# Altium footprint library Connectors.PcbLib: 229 footprints (part 12 of 15)
Each footprint in its own frame and in the unit in brackets; x right, y up, seen from the top. Pads: shape width x height; smd on the part's side, far side on the other; paste and mask are expansions set on the pad; w line width, h text height; cw(c..) or ccw(c..) is an arc to the next point about the centre after c.
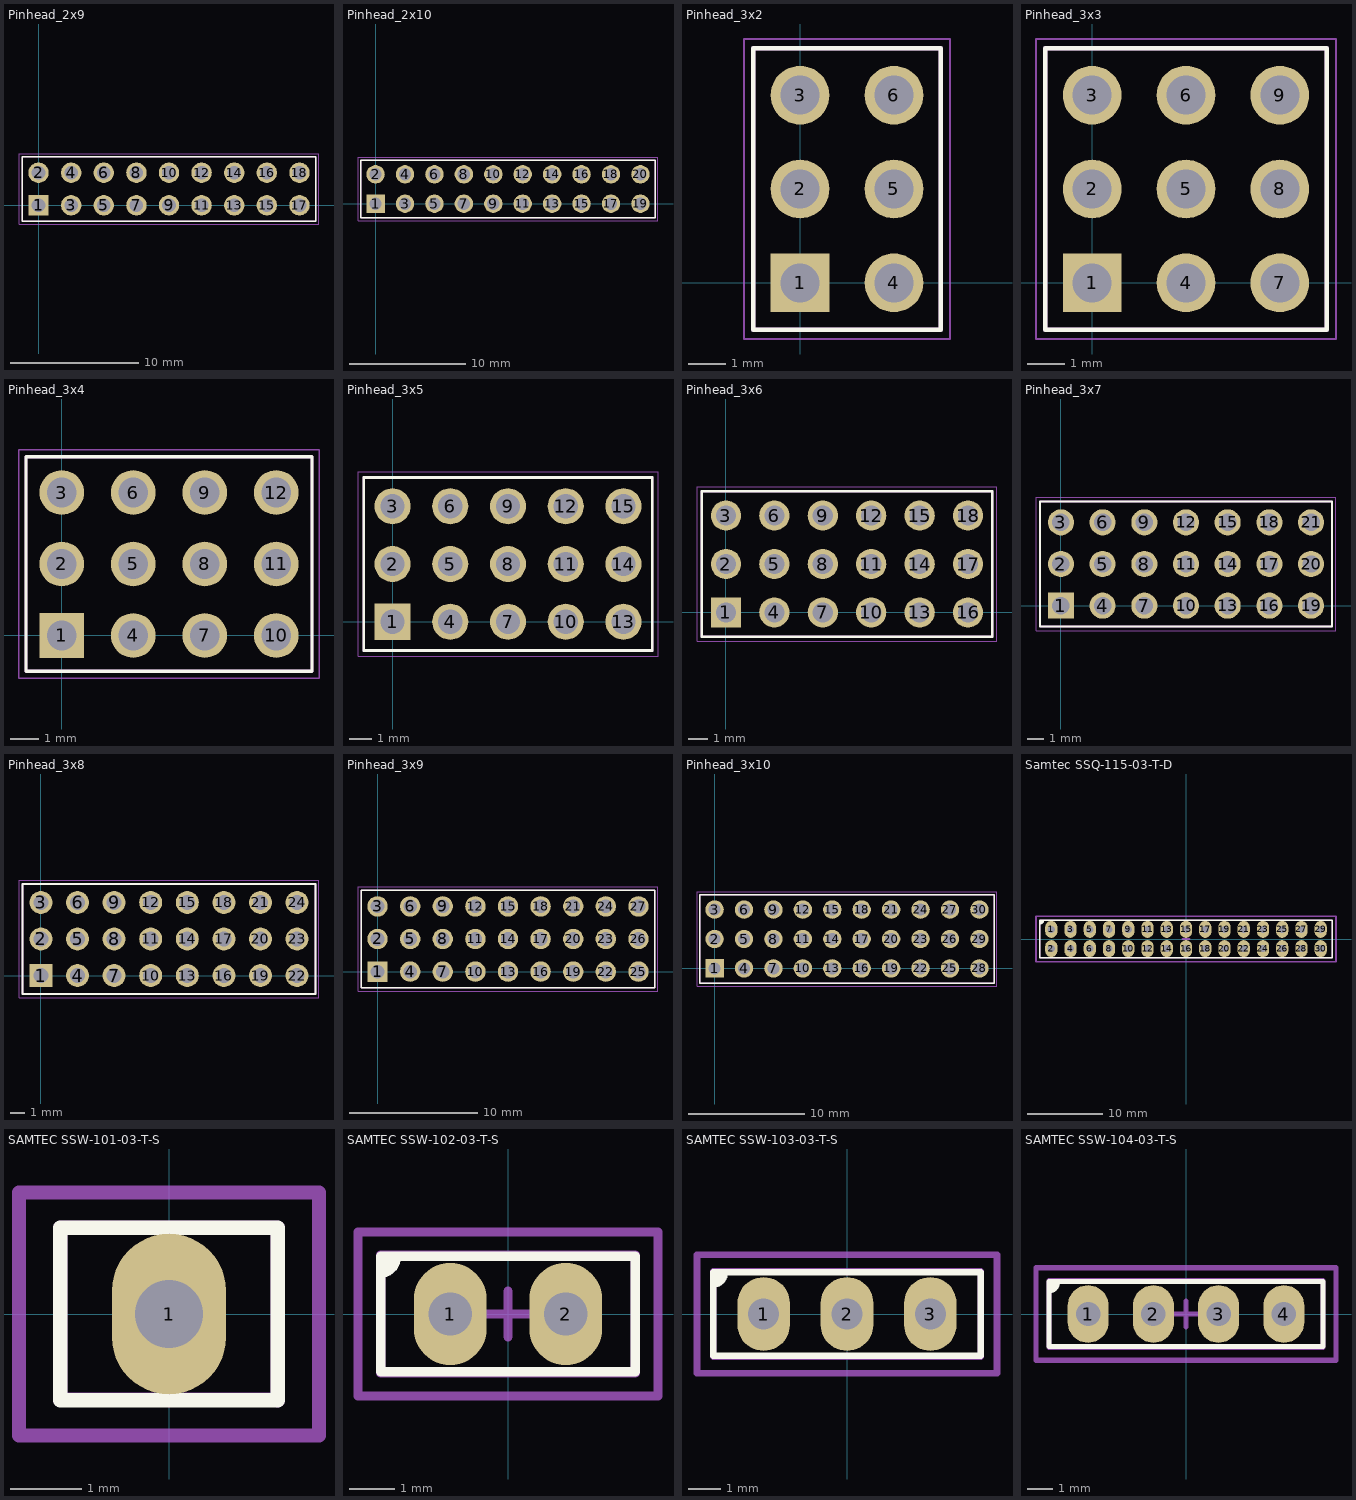
[diagram p11: the footprints below, top view; thin cyan lines are the x and y axes]

## Pinhead_2x9 [mm]
height 8.79
pads (18):
  rect 1.59x1.59 hole 1.06: 1(0,0)
  round 1.59 hole 1.06: 2(0,2.54) 3(2.54,0) 4(2.54,2.54) 5(5.08,0) 6(5.08,2.54) 7(7.62,0) 8(7.62,2.54) 9(10.16,0) 10(10.16,2.54) 11(12.7,0) 12(12.7,2.54) 13(15.24,0) 14(15.24,2.54) 15(17.78,0) 16(17.78,2.54) 17(20.32,0) 18(20.32,2.54)
Top Overlay:
  lines w0.12: -1.27,-1.23 21.59,-1.23 21.59,3.77 -1.27,3.77 -1.27,-1.23
Mechanical 8:
  lines w0.12: -1.27,-1.23 21.59,-1.23 21.59,3.77 -1.27,3.77 -1.27,-1.23
Mechanical 13:
  lines w0.025: -1.27,-1.23 21.59,-1.23 21.59,3.77 -1.27,3.77 -1.27,-1.23 ; -0.32,-0.32 0.32,-0.32 0.32,0.32 -0.32,0.32 -0.32,-0.32 ; -0.32,2.22 0.32,2.22 0.32,2.86 -0.32,2.86 -0.32,2.22 ; 2.22,-0.32 2.86,-0.32 2.86,0.32 2.22,0.32 2.22,-0.32 ; 2.22,2.22 2.86,2.22 2.86,2.86 2.22,2.86 2.22,2.22 ; 4.76,-0.32 5.4,-0.32 5.4,0.32 4.76,0.32 4.76,-0.32 ; 4.76,2.22 5.4,2.22 5.4,2.86 4.76,2.86 4.76,2.22 ; 7.3,-0.32 7.94,-0.32 7.94,0.32 7.3,0.32 7.3,-0.32 ; 7.3,2.22 7.94,2.22 7.94,2.86 7.3,2.86 7.3,2.22 ; 9.84,-0.32 10.48,-0.32 10.48,0.32 9.84,0.32 9.84,-0.32 ; 9.84,2.22 10.48,2.22 10.48,2.86 9.84,2.86 9.84,2.22 ; 12.38,-0.32 13.02,-0.32 13.02,0.32 12.38,0.32 12.38,-0.32 ; 12.38,2.22 13.02,2.22 13.02,2.86 12.38,2.86 12.38,2.22 ; 14.92,-0.32 15.56,-0.32 15.56,0.32 14.92,0.32 14.92,-0.32 ; 14.92,2.22 15.56,2.22 15.56,2.86 14.92,2.86 14.92,2.22 ; 17.46,-0.32 18.1,-0.32 18.1,0.32 17.46,0.32 17.46,-0.32 ; 17.46,2.22 18.1,2.22 18.1,2.86 17.46,2.86 17.46,2.22 ; 20,-0.32 20.64,-0.32 20.64,0.32 20,0.32 20,-0.32 ; 20,2.22 20.64,2.22 20.64,2.86 20,2.86 20,2.22
Mechanical 15:
  circle w0.05: c0,0 r0.25
  lines w0.05: -0.35,0 0.35,0 ; 0,-0.35 0,0.35 ; -1.52,-1.48 21.84,-1.48 21.84,4.02 -1.52,4.02 -1.52,-1.48
3D body: height 8.79, standoff -2.3, extent -1.27,-1.23 21.59,3.77

## Pinhead_2x10 [mm]
height 8.79
pads (20):
  rect 1.59x1.59 hole 1.06: 1(0,0)
  round 1.59 hole 1.06: 2(0,2.54) 3(2.54,0) 4(2.54,2.54) 5(5.08,0) 6(5.08,2.54) 7(7.62,0) 8(7.62,2.54) 9(10.16,0) 10(10.16,2.54) 11(12.7,0) 12(12.7,2.54) 13(15.24,0) 14(15.24,2.54) 15(17.78,0) 16(17.78,2.54) 17(20.32,0) 18(20.32,2.54) 19(22.86,0) 20(22.86,2.54)
Top Overlay:
  lines w0.12: -1.27,-1.23 24.13,-1.23 24.13,3.77 -1.27,3.77 -1.27,-1.23
Mechanical 8:
  lines w0.12: -1.27,-1.23 24.13,-1.23 24.13,3.77 -1.27,3.77 -1.27,-1.23
Mechanical 13:
  lines w0.025: -1.27,-1.23 24.13,-1.23 24.13,3.77 -1.27,3.77 -1.27,-1.23 ; -0.32,-0.32 0.32,-0.32 0.32,0.32 -0.32,0.32 -0.32,-0.32 ; -0.32,2.22 0.32,2.22 0.32,2.86 -0.32,2.86 -0.32,2.22 ; 2.22,-0.32 2.86,-0.32 2.86,0.32 2.22,0.32 2.22,-0.32 ; 2.22,2.22 2.86,2.22 2.86,2.86 2.22,2.86 2.22,2.22 ; 4.76,-0.32 5.4,-0.32 5.4,0.32 4.76,0.32 4.76,-0.32 ; 4.76,2.22 5.4,2.22 5.4,2.86 4.76,2.86 4.76,2.22 ; 7.3,-0.32 7.94,-0.32 7.94,0.32 7.3,0.32 7.3,-0.32 ; 7.3,2.22 7.94,2.22 7.94,2.86 7.3,2.86 7.3,2.22 ; 9.84,-0.32 10.48,-0.32 10.48,0.32 9.84,0.32 9.84,-0.32 ; 9.84,2.22 10.48,2.22 10.48,2.86 9.84,2.86 9.84,2.22 ; 12.38,-0.32 13.02,-0.32 13.02,0.32 12.38,0.32 12.38,-0.32 ; 12.38,2.22 13.02,2.22 13.02,2.86 12.38,2.86 12.38,2.22 ; 14.92,-0.32 15.56,-0.32 15.56,0.32 14.92,0.32 14.92,-0.32 ; 14.92,2.22 15.56,2.22 15.56,2.86 14.92,2.86 14.92,2.22 ; 17.46,-0.32 18.1,-0.32 18.1,0.32 17.46,0.32 17.46,-0.32 ; 17.46,2.22 18.1,2.22 18.1,2.86 17.46,2.86 17.46,2.22 ; 20,-0.32 20.64,-0.32 20.64,0.32 20,0.32 20,-0.32 ; 20,2.22 20.64,2.22 20.64,2.86 20,2.86 20,2.22 ; 22.54,-0.32 23.18,-0.32 23.18,0.32 22.54,0.32 22.54,-0.32 ; 22.54,2.22 23.18,2.22 23.18,2.86 22.54,2.86 22.54,2.22
Mechanical 15:
  circle w0.05: c0,0 r0.25
  lines w0.05: -0.35,0 0.35,0 ; 0,-0.35 0,0.35 ; -1.52,-1.48 24.38,-1.48 24.38,4.02 -1.52,4.02 -1.52,-1.48
3D body: height 8.79, standoff -2.3, extent -1.27,-1.23 24.13,3.77

## Pinhead_3x2 [mm]
height 8.79
pads (6):
  rect 1.59x1.59 hole 1.06: 1(0,0)
  round 1.59 hole 1.06: 2(0,2.54) 3(0,5.08) 4(2.54,0) 5(2.54,2.54) 6(2.54,5.08)
Top Overlay:
  lines w0.12: -1.27,-1.27 -1.27,6.35 3.81,6.35 3.81,-1.27 -1.27,-1.27
Mechanical 8:
  lines w0.12: -1.27,-1.27 -1.27,6.35 3.81,6.35 3.81,-1.27 -1.27,-1.27
Mechanical 13:
  lines w0.025: -1.27,-1.27 -1.27,6.35 3.81,6.35 3.81,-1.27 -1.27,-1.27 ; -0.32,-0.32 -0.32,0.32 0.32,0.32 0.32,-0.32 -0.32,-0.32 ; -0.32,2.22 -0.32,2.86 0.32,2.86 0.32,2.22 -0.32,2.22 ; -0.32,4.76 -0.32,5.4 0.32,5.4 0.32,4.76 -0.32,4.76 ; 2.22,-0.32 2.22,0.32 2.86,0.32 2.86,-0.32 2.22,-0.32 ; 2.22,2.22 2.22,2.86 2.86,2.86 2.86,2.22 2.22,2.22 ; 2.22,4.76 2.22,5.4 2.86,5.4 2.86,4.76 2.22,4.76
Mechanical 15:
  circle w0.05: c0,0 r0.25
  lines w0.05: -0.35,0 0.35,0 ; 0,-0.35 0,0.35 ; -1.52,-1.52 -1.52,6.6 4.06,6.6 4.06,-1.52 -1.52,-1.52
3D body: height 8.79, standoff -2.3, extent -1.27,-1.27 3.81,6.35

## Pinhead_3x3 [mm]
height 8.79
pads (9):
  rect 1.59x1.59 hole 1.06: 1(0,0)
  round 1.59 hole 1.06: 2(0,2.54) 3(0,5.08) 4(2.54,0) 5(2.54,2.54) 6(2.54,5.08) 7(5.08,0) 8(5.08,2.54) 9(5.08,5.08)
Top Overlay:
  lines w0.12: -1.27,-1.27 6.35,-1.27 6.35,6.35 -1.27,6.35 -1.27,-1.27
Mechanical 8:
  lines w0.12: -1.27,-1.27 6.35,-1.27 6.35,6.35 -1.27,6.35 -1.27,-1.27
Mechanical 13:
  lines w0.025: -1.27,-1.27 6.35,-1.27 6.35,6.35 -1.27,6.35 -1.27,-1.27 ; -0.32,-0.32 0.32,-0.32 0.32,0.32 -0.32,0.32 -0.32,-0.32 ; -0.32,2.22 0.32,2.22 0.32,2.86 -0.32,2.86 -0.32,2.22 ; -0.32,4.76 0.32,4.76 0.32,5.4 -0.32,5.4 -0.32,4.76 ; 2.22,-0.32 2.86,-0.32 2.86,0.32 2.22,0.32 2.22,-0.32 ; 2.22,2.22 2.86,2.22 2.86,2.86 2.22,2.86 2.22,2.22 ; 2.22,4.76 2.86,4.76 2.86,5.4 2.22,5.4 2.22,4.76 ; 4.76,-0.32 5.4,-0.32 5.4,0.32 4.76,0.32 4.76,-0.32 ; 4.76,2.22 5.4,2.22 5.4,2.86 4.76,2.86 4.76,2.22 ; 4.76,4.76 5.4,4.76 5.4,5.4 4.76,5.4 4.76,4.76
Mechanical 15:
  circle w0.05: c0,0 r0.25
  lines w0.05: -0.35,0 0.35,0 ; 0,-0.35 0,0.35 ; -1.52,-1.52 6.6,-1.52 6.6,6.6 -1.52,6.6 -1.52,-1.52
3D body: height 8.79, standoff -2.3, extent -1.27,-1.27 6.35,6.35

## Pinhead_3x4 [mm]
height 8.79
pads (12):
  rect 1.59x1.59 hole 1.06: 1(0,0)
  round 1.59 hole 1.06: 2(0,2.54) 3(0,5.08) 4(2.54,0) 5(2.54,2.54) 6(2.54,5.08) 7(5.08,0) 8(5.08,2.54) 9(5.08,5.08) 10(7.62,0) 11(7.62,2.54) 12(7.62,5.08)
Top Overlay:
  lines w0.12: -1.27,-1.27 8.89,-1.27 8.89,6.35 -1.27,6.35 -1.27,-1.27
Mechanical 8:
  lines w0.12: -1.27,-1.27 8.89,-1.27 8.89,6.35 -1.27,6.35 -1.27,-1.27
Mechanical 13:
  lines w0.025: -1.27,-1.27 8.89,-1.27 8.89,6.35 -1.27,6.35 -1.27,-1.27 ; -0.32,-0.32 0.32,-0.32 0.32,0.32 -0.32,0.32 -0.32,-0.32 ; -0.32,2.22 0.32,2.22 0.32,2.86 -0.32,2.86 -0.32,2.22 ; -0.32,4.76 0.32,4.76 0.32,5.4 -0.32,5.4 -0.32,4.76 ; 2.22,-0.32 2.86,-0.32 2.86,0.32 2.22,0.32 2.22,-0.32 ; 2.22,2.22 2.86,2.22 2.86,2.86 2.22,2.86 2.22,2.22 ; 2.22,4.76 2.86,4.76 2.86,5.4 2.22,5.4 2.22,4.76 ; 4.76,-0.32 5.4,-0.32 5.4,0.32 4.76,0.32 4.76,-0.32 ; 4.76,2.22 5.4,2.22 5.4,2.86 4.76,2.86 4.76,2.22 ; 4.76,4.76 5.4,4.76 5.4,5.4 4.76,5.4 4.76,4.76 ; 7.3,-0.32 7.94,-0.32 7.94,0.32 7.3,0.32 7.3,-0.32 ; 7.3,2.22 7.94,2.22 7.94,2.86 7.3,2.86 7.3,2.22 ; 7.3,4.76 7.94,4.76 7.94,5.4 7.3,5.4 7.3,4.76
Mechanical 15:
  circle w0.05: c0,0 r0.25
  lines w0.05: -0.35,0 0.35,0 ; 0,-0.35 0,0.35 ; -1.52,-1.52 9.14,-1.52 9.14,6.6 -1.52,6.6 -1.52,-1.52
3D body: height 8.79, standoff -2.3, extent -1.27,-1.27 8.89,6.35

## Pinhead_3x5 [mm]
height 8.79
pads (15):
  rect 1.59x1.59 hole 1.06: 1(0,0)
  round 1.59 hole 1.06: 2(0,2.54) 3(0,5.08) 4(2.54,0) 5(2.54,2.54) 6(2.54,5.08) 7(5.08,0) 8(5.08,2.54) 9(5.08,5.08) 10(7.62,0) 11(7.62,2.54) 12(7.62,5.08) 13(10.16,0) 14(10.16,2.54) 15(10.16,5.08)
Top Overlay:
  lines w0.12: -1.27,-1.27 11.43,-1.27 11.43,6.35 -1.27,6.35 -1.27,-1.27
Mechanical 8:
  lines w0.12: -1.27,-1.27 11.43,-1.27 11.43,6.35 -1.27,6.35 -1.27,-1.27
Mechanical 13:
  lines w0.025: -1.27,-1.27 11.43,-1.27 11.43,6.35 -1.27,6.35 -1.27,-1.27 ; -0.32,-0.32 0.32,-0.32 0.32,0.32 -0.32,0.32 -0.32,-0.32 ; -0.32,2.22 0.32,2.22 0.32,2.86 -0.32,2.86 -0.32,2.22 ; -0.32,4.76 0.32,4.76 0.32,5.4 -0.32,5.4 -0.32,4.76 ; 2.22,-0.32 2.86,-0.32 2.86,0.32 2.22,0.32 2.22,-0.32 ; 2.22,2.22 2.86,2.22 2.86,2.86 2.22,2.86 2.22,2.22 ; 2.22,4.76 2.86,4.76 2.86,5.4 2.22,5.4 2.22,4.76 ; 4.76,-0.32 5.4,-0.32 5.4,0.32 4.76,0.32 4.76,-0.32 ; 4.76,2.22 5.4,2.22 5.4,2.86 4.76,2.86 4.76,2.22 ; 4.76,4.76 5.4,4.76 5.4,5.4 4.76,5.4 4.76,4.76 ; 7.3,-0.32 7.94,-0.32 7.94,0.32 7.3,0.32 7.3,-0.32 ; 7.3,2.22 7.94,2.22 7.94,2.86 7.3,2.86 7.3,2.22 ; 7.3,4.76 7.94,4.76 7.94,5.4 7.3,5.4 7.3,4.76 ; 9.84,-0.32 10.48,-0.32 10.48,0.32 9.84,0.32 9.84,-0.32 ; 9.84,2.22 10.48,2.22 10.48,2.86 9.84,2.86 9.84,2.22 ; 9.84,4.76 10.48,4.76 10.48,5.4 9.84,5.4 9.84,4.76
Mechanical 15:
  circle w0.05: c0,0 r0.25
  lines w0.05: -0.35,0 0.35,0 ; 0,-0.35 0,0.35 ; -1.52,-1.52 11.68,-1.52 11.68,6.6 -1.52,6.6 -1.52,-1.52
3D body: height 8.79, standoff -2.3, extent -1.27,-1.27 11.43,6.35

## Pinhead_3x6 [mm]
height 8.79
pads (18):
  rect 1.59x1.59 hole 1.06: 1(0,0)
  round 1.59 hole 1.06: 2(0,2.54) 3(0,5.08) 4(2.54,0) 5(2.54,2.54) 6(2.54,5.08) 7(5.08,0) 8(5.08,2.54) 9(5.08,5.08) 10(7.62,0) 11(7.62,2.54) 12(7.62,5.08) 13(10.16,0) 14(10.16,2.54) 15(10.16,5.08) 16(12.7,0) 17(12.7,2.54) 18(12.7,5.08)
Top Overlay:
  lines w0.12: -1.27,-1.27 13.97,-1.27 13.97,6.35 -1.27,6.35 -1.27,-1.27
Mechanical 8:
  lines w0.12: -1.27,-1.27 13.97,-1.27 13.97,6.35 -1.27,6.35 -1.27,-1.27
Mechanical 13:
  lines w0.025: -1.27,-1.27 13.97,-1.27 13.97,6.35 -1.27,6.35 -1.27,-1.27 ; -0.32,-0.32 0.32,-0.32 0.32,0.32 -0.32,0.32 -0.32,-0.32 ; -0.32,2.22 0.32,2.22 0.32,2.86 -0.32,2.86 -0.32,2.22 ; -0.32,4.76 0.32,4.76 0.32,5.4 -0.32,5.4 -0.32,4.76 ; 2.22,-0.32 2.86,-0.32 2.86,0.32 2.22,0.32 2.22,-0.32 ; 2.22,2.22 2.86,2.22 2.86,2.86 2.22,2.86 2.22,2.22 ; 2.22,4.76 2.86,4.76 2.86,5.4 2.22,5.4 2.22,4.76 ; 4.76,-0.32 5.4,-0.32 5.4,0.32 4.76,0.32 4.76,-0.32 ; 4.76,2.22 5.4,2.22 5.4,2.86 4.76,2.86 4.76,2.22 ; 4.76,4.76 5.4,4.76 5.4,5.4 4.76,5.4 4.76,4.76 ; 7.3,-0.32 7.94,-0.32 7.94,0.32 7.3,0.32 7.3,-0.32 ; 7.3,2.22 7.94,2.22 7.94,2.86 7.3,2.86 7.3,2.22 ; 7.3,4.76 7.94,4.76 7.94,5.4 7.3,5.4 7.3,4.76 ; 9.84,-0.32 10.48,-0.32 10.48,0.32 9.84,0.32 9.84,-0.32 ; 9.84,2.22 10.48,2.22 10.48,2.86 9.84,2.86 9.84,2.22 ; 9.84,4.76 10.48,4.76 10.48,5.4 9.84,5.4 9.84,4.76 ; 12.38,-0.32 13.02,-0.32 13.02,0.32 12.38,0.32 12.38,-0.32 ; 12.38,2.22 13.02,2.22 13.02,2.86 12.38,2.86 12.38,2.22 ; 12.38,4.76 13.02,4.76 13.02,5.4 12.38,5.4 12.38,4.76
Mechanical 15:
  circle w0.05: c0,0 r0.25
  lines w0.05: -0.35,0 0.35,0 ; 0,-0.35 0,0.35 ; -1.52,-1.52 14.22,-1.52 14.22,6.6 -1.52,6.6 -1.52,-1.52
3D body: height 8.79, standoff -2.3, extent -1.27,-1.27 13.97,6.35

## Pinhead_3x7 [mm]
height 8.79
pads (21):
  rect 1.59x1.59 hole 1.06: 1(0,0)
  round 1.59 hole 1.06: 2(0,2.54) 3(0,5.08) 4(2.54,0) 5(2.54,2.54) 6(2.54,5.08) 7(5.08,0) 8(5.08,2.54) 9(5.08,5.08) 10(7.62,0) 11(7.62,2.54) 12(7.62,5.08) 13(10.16,0) 14(10.16,2.54) 15(10.16,5.08) 16(12.7,0) 17(12.7,2.54) 18(12.7,5.08) 19(15.24,0) 20(15.24,2.54) 21(15.24,5.08)
Top Overlay:
  lines w0.12: -1.27,-1.27 16.51,-1.27 16.51,6.35 -1.27,6.35 -1.27,-1.27
Mechanical 8:
  lines w0.12: -1.27,-1.27 16.51,-1.27 16.51,6.35 -1.27,6.35 -1.27,-1.27
Mechanical 13:
  lines w0.025: -1.27,-1.27 16.51,-1.27 16.51,6.35 -1.27,6.35 -1.27,-1.27 ; -0.32,-0.32 0.32,-0.32 0.32,0.32 -0.32,0.32 -0.32,-0.32 ; -0.32,2.22 0.32,2.22 0.32,2.86 -0.32,2.86 -0.32,2.22 ; -0.32,4.76 0.32,4.76 0.32,5.4 -0.32,5.4 -0.32,4.76 ; 2.22,-0.32 2.86,-0.32 2.86,0.32 2.22,0.32 2.22,-0.32 ; 2.22,2.22 2.86,2.22 2.86,2.86 2.22,2.86 2.22,2.22 ; 2.22,4.76 2.86,4.76 2.86,5.4 2.22,5.4 2.22,4.76 ; 4.76,-0.32 5.4,-0.32 5.4,0.32 4.76,0.32 4.76,-0.32 ; 4.76,2.22 5.4,2.22 5.4,2.86 4.76,2.86 4.76,2.22 ; 4.76,4.76 5.4,4.76 5.4,5.4 4.76,5.4 4.76,4.76 ; 7.3,-0.32 7.94,-0.32 7.94,0.32 7.3,0.32 7.3,-0.32 ; 7.3,2.22 7.94,2.22 7.94,2.86 7.3,2.86 7.3,2.22 ; 7.3,4.76 7.94,4.76 7.94,5.4 7.3,5.4 7.3,4.76 ; 9.84,-0.32 10.48,-0.32 10.48,0.32 9.84,0.32 9.84,-0.32 ; 9.84,2.22 10.48,2.22 10.48,2.86 9.84,2.86 9.84,2.22 ; 9.84,4.76 10.48,4.76 10.48,5.4 9.84,5.4 9.84,4.76 ; 12.38,-0.32 13.02,-0.32 13.02,0.32 12.38,0.32 12.38,-0.32 ; 12.38,2.22 13.02,2.22 13.02,2.86 12.38,2.86 12.38,2.22 ; 12.38,4.76 13.02,4.76 13.02,5.4 12.38,5.4 12.38,4.76 ; 14.92,-0.32 15.56,-0.32 15.56,0.32 14.92,0.32 14.92,-0.32 ; 14.92,2.22 15.56,2.22 15.56,2.86 14.92,2.86 14.92,2.22 ; 14.92,4.76 15.56,4.76 15.56,5.4 14.92,5.4 14.92,4.76
Mechanical 15:
  circle w0.05: c0,0 r0.25
  lines w0.05: -0.35,0 0.35,0 ; 0,-0.35 0,0.35 ; -1.52,-1.52 16.76,-1.52 16.76,6.6 -1.52,6.6 -1.52,-1.52
3D body: height 8.79, standoff -2.3, extent -1.27,-1.27 16.51,6.35

## Pinhead_3x8 [mm]
height 8.79
pads (24):
  rect 1.59x1.59 hole 1.06: 1(0,0)
  round 1.59 hole 1.06: 2(0,2.54) 3(0,5.08) 4(2.54,0) 5(2.54,2.54) 6(2.54,5.08) 7(5.08,0) 8(5.08,2.54) 9(5.08,5.08) 10(7.62,0) 11(7.62,2.54) 12(7.62,5.08) 13(10.16,0) 14(10.16,2.54) 15(10.16,5.08) 16(12.7,0) 17(12.7,2.54) 18(12.7,5.08) 19(15.24,0) 20(15.24,2.54) 21(15.24,5.08) 22(17.78,0) 23(17.78,2.54) 24(17.78,5.08)
Top Overlay:
  lines w0.12: -1.27,-1.27 19.05,-1.27 19.05,6.35 -1.27,6.35 -1.27,-1.27
Mechanical 8:
  lines w0.12: -1.27,-1.27 19.05,-1.27 19.05,6.35 -1.27,6.35 -1.27,-1.27
Mechanical 13:
  lines w0.025: -1.27,-1.27 19.05,-1.27 19.05,6.35 -1.27,6.35 -1.27,-1.27 ; -0.32,-0.32 0.32,-0.32 0.32,0.32 -0.32,0.32 -0.32,-0.32 ; -0.32,2.22 0.32,2.22 0.32,2.86 -0.32,2.86 -0.32,2.22 ; -0.32,4.76 0.32,4.76 0.32,5.4 -0.32,5.4 -0.32,4.76 ; 2.22,-0.32 2.86,-0.32 2.86,0.32 2.22,0.32 2.22,-0.32 ; 2.22,2.22 2.86,2.22 2.86,2.86 2.22,2.86 2.22,2.22 ; 2.22,4.76 2.86,4.76 2.86,5.4 2.22,5.4 2.22,4.76 ; 4.76,-0.32 5.4,-0.32 5.4,0.32 4.76,0.32 4.76,-0.32 ; 4.76,2.22 5.4,2.22 5.4,2.86 4.76,2.86 4.76,2.22 ; 4.76,4.76 5.4,4.76 5.4,5.4 4.76,5.4 4.76,4.76 ; 7.3,-0.32 7.94,-0.32 7.94,0.32 7.3,0.32 7.3,-0.32 ; 7.3,2.22 7.94,2.22 7.94,2.86 7.3,2.86 7.3,2.22 ; 7.3,4.76 7.94,4.76 7.94,5.4 7.3,5.4 7.3,4.76 ; 9.84,-0.32 10.48,-0.32 10.48,0.32 9.84,0.32 9.84,-0.32 ; 9.84,2.22 10.48,2.22 10.48,2.86 9.84,2.86 9.84,2.22 ; 9.84,4.76 10.48,4.76 10.48,5.4 9.84,5.4 9.84,4.76 ; 12.38,-0.32 13.02,-0.32 13.02,0.32 12.38,0.32 12.38,-0.32 ; 12.38,2.22 13.02,2.22 13.02,2.86 12.38,2.86 12.38,2.22 ; 12.38,4.76 13.02,4.76 13.02,5.4 12.38,5.4 12.38,4.76 ; 14.92,-0.32 15.56,-0.32 15.56,0.32 14.92,0.32 14.92,-0.32 ; 14.92,2.22 15.56,2.22 15.56,2.86 14.92,2.86 14.92,2.22 ; 14.92,4.76 15.56,4.76 15.56,5.4 14.92,5.4 14.92,4.76 ; 17.46,-0.32 18.1,-0.32 18.1,0.32 17.46,0.32 17.46,-0.32 ; 17.46,2.22 18.1,2.22 18.1,2.86 17.46,2.86 17.46,2.22 ; 17.46,4.76 18.1,4.76 18.1,5.4 17.46,5.4 17.46,4.76
Mechanical 15:
  circle w0.05: c0,0 r0.25
  lines w0.05: -0.35,0 0.35,0 ; 0,-0.35 0,0.35 ; -1.52,-1.52 19.3,-1.52 19.3,6.6 -1.52,6.6 -1.52,-1.52
3D body: height 8.79, standoff -2.3, extent -1.27,-1.27 19.05,6.35

## Pinhead_3x9 [mm]
height 8.79
pads (27):
  rect 1.59x1.59 hole 1.06: 1(0,0)
  round 1.59 hole 1.06: 2(0,2.54) 3(0,5.08) 4(2.54,0) 5(2.54,2.54) 6(2.54,5.08) 7(5.08,0) 8(5.08,2.54) 9(5.08,5.08) 10(7.62,0) 11(7.62,2.54) 12(7.62,5.08) 13(10.16,0) 14(10.16,2.54) 15(10.16,5.08) 16(12.7,0) 17(12.7,2.54) 18(12.7,5.08) 19(15.24,0) 20(15.24,2.54) 21(15.24,5.08) 22(17.78,0) 23(17.78,2.54) 24(17.78,5.08) 25(20.32,0) 26(20.32,2.54) 27(20.32,5.08)
Top Overlay:
  lines w0.12: -1.27,-1.27 21.59,-1.27 21.59,6.35 -1.27,6.35 -1.27,-1.27
Mechanical 8:
  lines w0.12: -1.27,-1.27 21.59,-1.27 21.59,6.35 -1.27,6.35 -1.27,-1.27
Mechanical 13:
  lines w0.025: -1.27,-1.27 21.59,-1.27 21.59,6.35 -1.27,6.35 -1.27,-1.27 ; -0.32,-0.32 0.32,-0.32 0.32,0.32 -0.32,0.32 -0.32,-0.32 ; -0.32,2.22 0.32,2.22 0.32,2.86 -0.32,2.86 -0.32,2.22 ; -0.32,4.76 0.32,4.76 0.32,5.4 -0.32,5.4 -0.32,4.76 ; 2.22,-0.32 2.86,-0.32 2.86,0.32 2.22,0.32 2.22,-0.32 ; 2.22,2.22 2.86,2.22 2.86,2.86 2.22,2.86 2.22,2.22 ; 2.22,4.76 2.86,4.76 2.86,5.4 2.22,5.4 2.22,4.76 ; 4.76,-0.32 5.4,-0.32 5.4,0.32 4.76,0.32 4.76,-0.32 ; 4.76,2.22 5.4,2.22 5.4,2.86 4.76,2.86 4.76,2.22 ; 4.76,4.76 5.4,4.76 5.4,5.4 4.76,5.4 4.76,4.76 ; 7.3,-0.32 7.94,-0.32 7.94,0.32 7.3,0.32 7.3,-0.32 ; 7.3,2.22 7.94,2.22 7.94,2.86 7.3,2.86 7.3,2.22 ; 7.3,4.76 7.94,4.76 7.94,5.4 7.3,5.4 7.3,4.76 ; 9.84,-0.32 10.48,-0.32 10.48,0.32 9.84,0.32 9.84,-0.32 ; 9.84,2.22 10.48,2.22 10.48,2.86 9.84,2.86 9.84,2.22 ; 9.84,4.76 10.48,4.76 10.48,5.4 9.84,5.4 9.84,4.76 ; 12.38,-0.32 13.02,-0.32 13.02,0.32 12.38,0.32 12.38,-0.32 ; 12.38,2.22 13.02,2.22 13.02,2.86 12.38,2.86 12.38,2.22 ; 12.38,4.76 13.02,4.76 13.02,5.4 12.38,5.4 12.38,4.76 ; 14.92,-0.32 15.56,-0.32 15.56,0.32 14.92,0.32 14.92,-0.32 ; 14.92,2.22 15.56,2.22 15.56,2.86 14.92,2.86 14.92,2.22 ; 14.92,4.76 15.56,4.76 15.56,5.4 14.92,5.4 14.92,4.76 ; 17.46,-0.32 18.1,-0.32 18.1,0.32 17.46,0.32 17.46,-0.32 ; 17.46,2.22 18.1,2.22 18.1,2.86 17.46,2.86 17.46,2.22 ; 17.46,4.76 18.1,4.76 18.1,5.4 17.46,5.4 17.46,4.76 ; 20,-0.32 20.64,-0.32 20.64,0.32 20,0.32 20,-0.32 ; 20,2.22 20.64,2.22 20.64,2.86 20,2.86 20,2.22 ; 20,4.76 20.64,4.76 20.64,5.4 20,5.4 20,4.76
Mechanical 15:
  circle w0.05: c0,0 r0.25
  lines w0.05: -0.35,0 0.35,0 ; 0,-0.35 0,0.35 ; -1.52,-1.52 21.84,-1.52 21.84,6.6 -1.52,6.6 -1.52,-1.52
3D body: height 8.79, standoff -2.3, extent -1.27,-1.27 21.59,6.35

## Pinhead_3x10 [mm]
height 8.79
pads (30):
  rect 1.59x1.59 hole 1.06: 1(0,0)
  round 1.59 hole 1.06: 2(0,2.54) 3(0,5.08) 4(2.54,0) 5(2.54,2.54) 6(2.54,5.08) 7(5.08,0) 8(5.08,2.54) 9(5.08,5.08) 10(7.62,0) 11(7.62,2.54) 12(7.62,5.08) 13(10.16,0) 14(10.16,2.54) 15(10.16,5.08) 16(12.7,0) 17(12.7,2.54) 18(12.7,5.08) 19(15.24,0) 20(15.24,2.54) 21(15.24,5.08) 22(17.78,0) 23(17.78,2.54) 24(17.78,5.08) 25(20.32,0) 26(20.32,2.54) 27(20.32,5.08) 28(22.86,0) 29(22.86,2.54) 30(22.86,5.08)
Top Overlay:
  lines w0.12: -1.27,-1.27 -1.27,6.35 24.13,6.35 24.13,-1.27 -1.27,-1.27
Mechanical 8:
  lines w0.12: -1.27,-1.27 -1.27,6.35 24.13,6.35 24.13,-1.27 -1.27,-1.27
Mechanical 13:
  lines w0.025: -1.27,-1.27 -1.27,6.35 24.13,6.35 24.13,-1.27 -1.27,-1.27 ; -0.32,-0.32 -0.32,0.32 0.32,0.32 0.32,-0.32 -0.32,-0.32 ; -0.32,2.22 -0.32,2.86 0.32,2.86 0.32,2.22 -0.32,2.22 ; -0.32,4.76 -0.32,5.4 0.32,5.4 0.32,4.76 -0.32,4.76 ; 2.22,-0.32 2.22,0.32 2.86,0.32 2.86,-0.32 2.22,-0.32 ; 2.22,2.22 2.22,2.86 2.86,2.86 2.86,2.22 2.22,2.22 ; 2.22,4.76 2.22,5.4 2.86,5.4 2.86,4.76 2.22,4.76 ; 4.76,-0.32 4.76,0.32 5.4,0.32 5.4,-0.32 4.76,-0.32 ; 4.76,2.22 4.76,2.86 5.4,2.86 5.4,2.22 4.76,2.22 ; 4.76,4.76 4.76,5.4 5.4,5.4 5.4,4.76 4.76,4.76 ; 7.3,-0.32 7.3,0.32 7.94,0.32 7.94,-0.32 7.3,-0.32 ; 7.3,2.22 7.3,2.86 7.94,2.86 7.94,2.22 7.3,2.22 ; 7.3,4.76 7.3,5.4 7.94,5.4 7.94,4.76 7.3,4.76 ; 9.84,-0.32 9.84,0.32 10.48,0.32 10.48,-0.32 9.84,-0.32 ; 9.84,2.22 9.84,2.86 10.48,2.86 10.48,2.22 9.84,2.22 ; 9.84,4.76 9.84,5.4 10.48,5.4 10.48,4.76 9.84,4.76 ; 12.38,-0.32 12.38,0.32 13.02,0.32 13.02,-0.32 12.38,-0.32 ; 12.38,2.22 12.38,2.86 13.02,2.86 13.02,2.22 12.38,2.22 ; 12.38,4.76 12.38,5.4 13.02,5.4 13.02,4.76 12.38,4.76 ; 14.92,-0.32 14.92,0.32 15.56,0.32 15.56,-0.32 14.92,-0.32 ; 14.92,2.22 14.92,2.86 15.56,2.86 15.56,2.22 14.92,2.22 ; 14.92,4.76 14.92,5.4 15.56,5.4 15.56,4.76 14.92,4.76 ; 17.46,-0.32 17.46,0.32 18.1,0.32 18.1,-0.32 17.46,-0.32 ; 17.46,2.22 17.46,2.86 18.1,2.86 18.1,2.22 17.46,2.22 ; 17.46,4.76 17.46,5.4 18.1,5.4 18.1,4.76 17.46,4.76 ; 20,-0.32 20,0.32 20.64,0.32 20.64,-0.32 20,-0.32 ; 20,2.22 20,2.86 20.64,2.86 20.64,2.22 20,2.22 ; 20,4.76 20,5.4 20.64,5.4 20.64,4.76 20,4.76 ; 22.54,-0.32 22.54,0.32 23.18,0.32 23.18,-0.32 22.54,-0.32 ; 22.54,2.22 22.54,2.86 23.18,2.86 23.18,2.22 22.54,2.22 ; 22.54,4.76 22.54,5.4 23.18,5.4 23.18,4.76 22.54,4.76
Mechanical 15:
  circle w0.05: c0,0 r0.25
  lines w0.05: -0.35,0 0.35,0 ; 0,-0.35 0,0.35 ; -1.52,-1.52 -1.52,6.6 24.38,6.6 24.38,-1.52 -1.52,-1.52
3D body: height 8.79, standoff -2.3, extent -1.27,-1.27 24.13,6.35

## Samtec SSQ-115-03-T-D [mm]
height 8.51
pads (30):
  oval 1.6x2.25 hole 0.95: 1(-17.78,1.27) 2(-17.78,-1.27) 3(-15.24,1.27) 4(-15.24,-1.27) 5(-12.7,1.27) 6(-12.7,-1.27) 7(-10.16,1.27) 8(-10.16,-1.27) 9(-7.62,1.27) 10(-7.62,-1.27) 11(-5.08,1.27) 12(-5.08,-1.27) 13(-2.54,1.27) 14(-2.54,-1.27) 15(0,1.27) 16(0,-1.27) 17(2.54,1.27) 18(2.54,-1.27) 19(5.08,1.27) 20(5.08,-1.27) 21(7.62,1.27) 22(7.62,-1.27) 23(10.16,1.27) 24(10.16,-1.27) 25(12.7,1.27) 26(12.7,-1.27) 27(15.24,1.27) 28(15.24,-1.27) 29(17.78,1.27) 30(17.78,-1.27)
Top Overlay:
  region: -19.3,2.5 -18.8,2.5 -18.8,2.3 -19.1,2 -19.3,2
  lines w0.2: -19.3,2 ccw(c-19.3,2.5) -18.8,2.5 ; -19.3,-2.5 19.3,-2.5 19.3,2.5 -19.3,2.5 -19.3,-2.5
Mechanical 13:
  lines w0.2: -19.304,-2.476 -19.304,2.477 19.304,2.477 19.304,-2.476 -19.304,-2.476
Mechanical 15:
  lines w0.2: -0.5,0 0.5,0 ; 0,-0.5 0,0.5 ; -19.8,-3 -19.8,3 19.8,3 19.8,-3 -19.8,-3
3D body: height 8.51, standoff -10.01, extent -19.304,-2.476 19.304,2.477

## SAMTEC SSW-101-03-T-S [mm]
height 8.51
pads (1):
  oval 1.6x2.25 hole 0.95: 1(0,0)
Top Overlay:
  lines w0.2: 1.524,-1.2 1.524,-1.206 ; 1.524,-1.206 -1.524,-1.206 -1.524,1.207 1.524,1.207 1.524,-1.206
Mechanical 13:
  lines w0.2: 1.524,-1.206 1.524,1.207 -1.524,1.207 -1.524,-1.2 1.524,-1.2
Mechanical 15:
  lines w0.2: -0.5,0 0.5,0 ; 0,-0.5 0,0.5 ; -2.1,-1.7 2.1,-1.7 2.1,1.7 -2.1,1.7 -2.1,-1.7
3D body: height 8.51, standoff -10.01, extent -1.524,-1.206 1.524,1.207

## SAMTEC SSW-102-03-T-S [mm]
height 8.51
pads (2):
  oval 1.6x2.25 hole 0.95: 1(-1.27,0) 2(1.27,0)
Top Overlay:
  region: -2.8,1.27 -2.46,1.27 -2.46,1.1 -2.66,0.9 -2.8,0.9
  lines w0.2: -2.8,0.9 ccw(c-2.8,1.24) -2.46,1.24 -2.46,1.27 ; -2.8,-1.27 -2.8,1.27 2.8,1.27 2.8,-1.27 -2.8,-1.27
Mechanical 13:
  lines w0.2: -2.8,-1.3 2.8,-1.3 2.8,1.3 -2.8,1.3 -2.8,-1.3
Mechanical 15:
  lines w0.2: -0.5,0 0.5,0 ; 0,-0.5 0,0.5 ; -3.3,-1.8 -3.3,1.8 3.3,1.8 3.3,-1.8 -3.3,-1.8
3D body: height 8.51, standoff -10.01, extent -2.794,-1.206 2.794,1.207

## SAMTEC SSW-103-03-T-S [mm]
height 8.51
pads (3):
  oval 1.6x2.25 hole 0.95: 1(-2.54,0) 2(0,0) 3(2.54,0)
Top Overlay:
  region: -4.07,1.27 -3.73,1.27 -3.73,1.1 -3.93,0.9 -4.07,0.9
  lines w0.2: -4.07,0.9 ccw(c-4.07,1.24) -3.73,1.24 -3.73,1.27 ; -4.07,-1.27 4.07,-1.27 4.07,1.27 -4.07,1.27 -4.07,-1.27
Mechanical 13:
  lines w0.2: -4.07,-1.3 -4.07,1.3 4.07,1.3 4.07,-1.3 -4.07,-1.3
Mechanical 15:
  lines w0.2: -0.5,0 0.5,0 ; 0,-0.5 0,0.5 ; -4.57,-1.8 4.57,-1.8 4.57,1.8 -4.57,1.8 -4.57,-1.8
3D body: height 8.51, standoff -10.01, extent -4.064,-1.206 4.064,1.207

## SAMTEC SSW-104-03-T-S [mm]
height 8.51
pads (4):
  oval 1.6x2.25 hole 0.95: 1(-3.81,0) 2(-1.27,0) 3(1.27,0) 4(3.81,0)
Top Overlay:
  region: -5.34,1.27 -5,1.27 -5,1.1 -5.2,0.9 -5.34,0.9
  lines w0.2: -5.34,0.9 ccw(c-5.34,1.24) -5,1.24 -5,1.27 ; -5.34,-1.27 5.34,-1.27 5.34,1.27 -5.34,1.27 -5.34,-1.27
Mechanical 13:
  lines w0.2: -5.34,-1.3 -5.34,1.3 5.34,1.3 5.34,-1.3 -5.34,-1.3
Mechanical 15:
  lines w0.2: -0.5,0 0.5,0 ; 0,-0.5 0,0.5 ; -5.84,-1.8 5.84,-1.8 5.84,1.8 -5.84,1.8 -5.84,-1.8
3D body: height 8.51, standoff -10.01, extent -5.334,-1.206 5.334,1.207